# Altium footprint library XU-GENARAL PCB .PcbLib: 1176 footprints (part 63 of 75)
Each footprint in its own frame and in the unit in brackets; x right, y up, seen from the top. Pads: shape width x height; smd on the part's side, far side on the other; paste and mask are expansions set on the pad; w line width, h text height; cw(c..) or ccw(c..) is an arc to the next point about the centre after c.
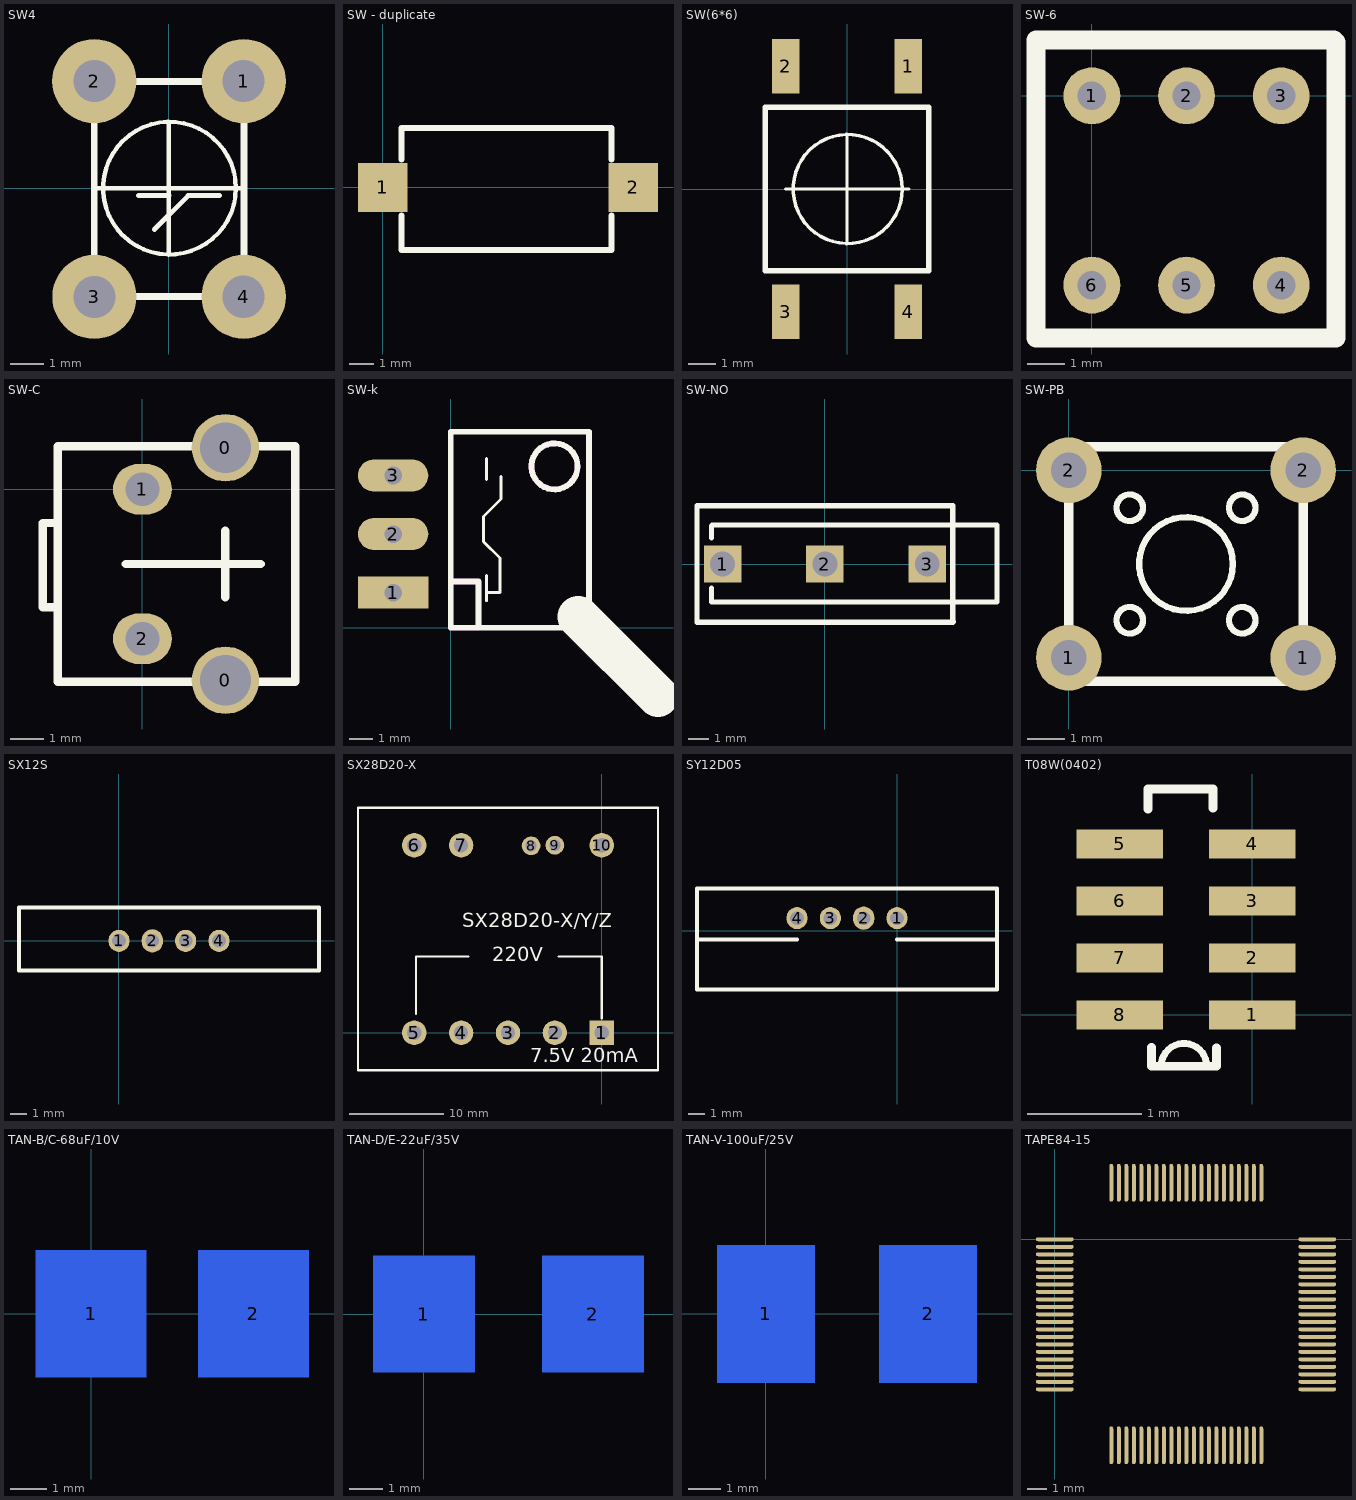
[diagram p62: the footprints below, top view; thin cyan lines are the x and y axes]

## SW4 [mil]
pads (4):
  round 100 hole 50: 1(89,127) 2(-88.17,127) 3(-88.09,-128.98) 4(89,-128.91)
Top Overlay:
  circle w5: c1,0 r78.74
  lines w5: -88.48,0 89.47,0 ; 0,-79 0,1 ; 0,0 0,79
  lines w5.91: -35.76,-8.9 0.24,-8.9 ; -16.76,-48.91 23.24,-8.91 60.24,-8.91
  lines w7.87: -88.48,-79.38 -88.48,79.68 ; -42.81,126.53 43.02,126.53 ; -40.84,-128.59 42.62,-128.59 ; 89.47,-77.8 89.47,79.68

## SW - duplicate [mm]
height 6.8
pads (2):
  rect 2x2 smd: 1(0,0) 2(10.16,0)
Top Overlay:
  lines w0.254: 0.762,-1.143 0.762,-2.54 9.271,-2.54 9.271,-1.143 ; 0.762,1.143 0.762,2.413 9.271,2.413 9.271,1.143

## SW(6*6) [mm]
pads (4):
  rect 1x2 smd: 1(2.25,4.5) 2(-2.25,4.5) 3(-2.25,-4.5) 4(2.25,-4.5)
Top Overlay:
  circle w0.127: c0.025,0 r2
  lines w0.127: -2.247,0 2.273,0 ; 0,-2.007 0,0.025 ; 0,0 0,2.007
  lines w0.2: -3,-3 -3,3 3,3 3,-3 -3,-3

## SW-6 [mil]
pads (6):
  round 60 hole 30: 1(0,0) 2(100,0) 3(200,0) 4(200,-200) 5(100,-200) 6(0,-200)
Top Overlay:
  lines w20: 255.91,59.06 -59.06,59.06 -59.06,-255.91 257.91,-255.91 257.91,57.06

## SW-C [mil]
pads (4):
  round 80 hole 60: 0(98.42,-226.38) 0(98.42,49.21)
  oval 70x60 hole 40: 1(0,0) 2(0,-177.16)
Top Overlay:
  lines w10: -100.39,-140 -118.11,-140 -118.11,-40 -100.39,-40 ; -20,-88.58 140,-88.58 ; 98.42,-127.95 98.42,-49.21 ; -100.39,-228.35 181.1,-228.35 181.1,51.18 -100.39,51.18 -100.39,-228.35

## SW-k [mil]
pads (3):
  rect 120x55 hole 30: 1(-98.42,60)
  oval 120x55 hole 30: 2(-98.42,160) 3(-98.42,260)
Top Overlay:
  circle w10: c177.16,275.59 r39.37
  lines w5: 61,46 61,89 ; 61,60 84,60 84,119 56,147 56,166 56,190 86,220 86,258 ; 61,253 61,289
  lines w10: 0,78.74 47.24,78.74 47.24,0 ; 0,0 236.22,0 236.22,334.65 0,334.65 0,0
  lines w70.87: 218,19 354,-117
Keep-Out Layer:
  circle w10: c177.16,275.59 r39.37
  lines w10: 0,0 47.24,0 47.24,78.74 0,78.74 0,0

## SW-NO [mil]
pads (3):
  rect 72x72 hole 48: 1(-196.85,0) 2(0,0) 3(196.85,0)
Top Overlay:
  lines w10: -218,-46 -218,-73 331,-73 331,75 -217,75 ; -218,50 -218,73 ; 247,-111.27 246.06,-112.2 ; 246.06,-112.2 0,-112.2 -246.06,-112.2 -246.06,112.2 246.06,112.2 246.06,-112.2

## SW-PB [mil] "switch kai guan"
height 68.9
pads (4):
  round 70 hole 38: 1(0,-200) 1(250,-200) 2(0,0) 2(250,0)
Top Overlay:
  circle w6.69: c65,-160 r14.14
  circle w6.69: c65,-40 r14.14
  circle w6.69: c185,-40 r14.14
  circle w6.69: c185,-160 r14.14
  circle w6.69: c125,-100 r50
  lines w10: 0,-225 250,-225 250,25 0,25 0,-225

## SX12S [mil]
pads (4):
  oval 50x52 hole 32: 1(0,0) 3(157.48,0) 4(236.22,0)
  oval 50x55 hole 32: 2(78.74,0)
Top Overlay:
  lines w10: 472.44,50 472.44,78.56 472.22,78.78 -236.22,78.78 -236.22,51.53 -236.22,-70 472.44,-70 472.44,50.53

## SX28D20-X [mm]
pads (10):
  rect 2.6x2.6 hole 1.5: 1(0,0)
  round 2.6 hole 1.5: 2(-5,0) 3(-10,0) 4(-15,0) 5(-20,0) 6(-20,20) 7(-15,20) 10(0,20)
  round 2 hole 1.2: 8(-7.54,19.939) 9(-5,20)
Top Overlay:
  lines w0.254: -19.812,2.032 -19.812,8.128 -14.224,8.128 ; -4.572,8.128 0,8.128 0,1.524 ; -26,-4 6,-4 6,24 -26,24 -26,-4
  text "SX28D20-X/Y/Z" at -14.884,11.278 h1.52
  text "220V" at -11.684,7.62 h1.52
  text "7.5V 20mA" at -7.62,-3.124 h1.52

## SY12D05 [mil]
pads (4):
  oval 50x52 hole 32: 1(0,30) 3(-157.48,30) 4(-236.22,30)
  oval 50x55 hole 32: 2(-78.74,30)
Top Overlay:
  lines w10: -236.22,-20.53 -472.44,-20.53 ; 0,-20.53 236.22,-20.53 236.22,-138.64 -472.44,-138.64 -472.44,-20.53 ; 236.22,-21.53 236.22,100 -472.44,100 -472.44,-20.53

## T08W(0402) [mil]
pads (8):
  rect 30x10 smd: 1(0,0) 2(0,19.68) 3(0,39.37) 4(0,59.05) 5(-45.75,59.05) 6(-45.75,39.37) 7(-45.75,19.68) 8(-45.75,0)
Top Overlay:
  lines w2.36: -36,78 -13.56,78 ; -34.81,-17.75 -15.72,-17.75 ccw(c-23.59,-17.75) -31.46,-17.75 -12.37,-17.75
  lines w3: -36,71 -36,78 -13.56,78 -13.56,71.44 ; -34.81,-11.19 -34.81,-17.75 -12.37,-17.75 -12.37,-11.37

## TAN-B/C-68uF/10V [mil]
pads (2):
  rect 120x137.8 smd far side: 1(0,0) 2(176,0)
Bottom Overlay:
  lines w5: -78,-68 -78,63 ; -78,64 -63,79 25,79 ; -77.5,-68.5 -66.5,-79.5 ; -67,-79 29,-79 ; 172,-79 246,-79 247,-78 247,78 ; 172,79 247,79

## TAN-D/E-22uF/35V [mil]
pads (2):
  rect 120x137.8 smd far side: 1(0,0) 2(200,0)
Bottom Overlay:
  lines w5: -78,-68 -78,63 ; -78,64 -63,79 25,79 ; -77.5,-68.5 -66.5,-79.5 ; -67,-79 29,-79 ; 201.01,80 276.01,80 276.01,-79 ; 202,-80 277,-80

## TAN-V-100uF/25V [mil]
pads (2):
  rect 120x169.29 smd far side: 1(0,0) 2(200,0)
Bottom Overlay:
  lines w5: -83.99,74.97 -63.96,95 -3.99,95 ; -83.99,75 -83.99,-75.03 -63.99,-95.03 -3.99,-95.03 ; -33.99,94.97 -34.02,95 ; 201.01,-95.03 276.01,-95.03 276.01,95 201.01,95

## TAPE84-15 [mil]
pads (84):
  oval 75x8 smd: 1(0,0) 2(0,-15) 3(0,-30) 4(0,-45) 5(0,-60) 6(0,-75) 7(0,-90) 8(0,-105) 9(0,-120) 10(0,-135) 11(0,-150) 12(0,-165) 13(0,-180) 14(0,-195) 15(0,-210) 16(0,-225) 17(0,-240) 18(0,-255) 19(0,-270) 20(0,-285) 21(0,-300) 43(525,-300) 44(525,-285) 45(525,-270) 46(525,-255) 47(525,-240) 48(525,-225) 49(525,-210) 50(525,-195) 51(525,-180) 52(525,-165) 53(525,-150) 54(525,-135) 55(525,-120) 56(525,-105) 57(525,-90) 58(525,-75) 59(525,-60) 60(525,-45) 61(525,-30) 62(525,-15) 63(525,0)
  oval 8x75 smd: 22(113,-412) 23(128,-412) 24(143,-412) 25(158,-412) 26(173,-412) 27(188,-412) 28(203,-412) 29(218,-412) 30(233,-412) 31(248,-412) 32(263,-412) 33(278,-412) 34(293,-412) 35(308,-412) 36(323,-412) 37(338,-412) 38(353,-412) 39(368,-412) 40(383,-412) 41(398,-412) 42(413,-412) 64(413,113) 65(398,113) 66(383,113) 67(368,113) 68(353,113) 69(338,113) 70(323,113) 71(308,113) 72(293,113) 73(278,113) 74(263,113) 75(248,113) 76(233,113) 77(218,113) 78(203,113) 79(188,113) 80(173,113) 81(158,113) 82(143,113) 83(128,113) 84(113,113)